# Altium footprint library Standard.PcbLib: 137 footprints (part 3 of 9)
Each footprint in its own frame and in the unit in brackets; x right, y up, seen from the top. Pads: shape width x height; smd on the part's side, far side on the other; paste and mask are expansions set on the pad; w line width, h text height; cw(c..) or ccw(c..) is an arc to the next point about the centre after c.
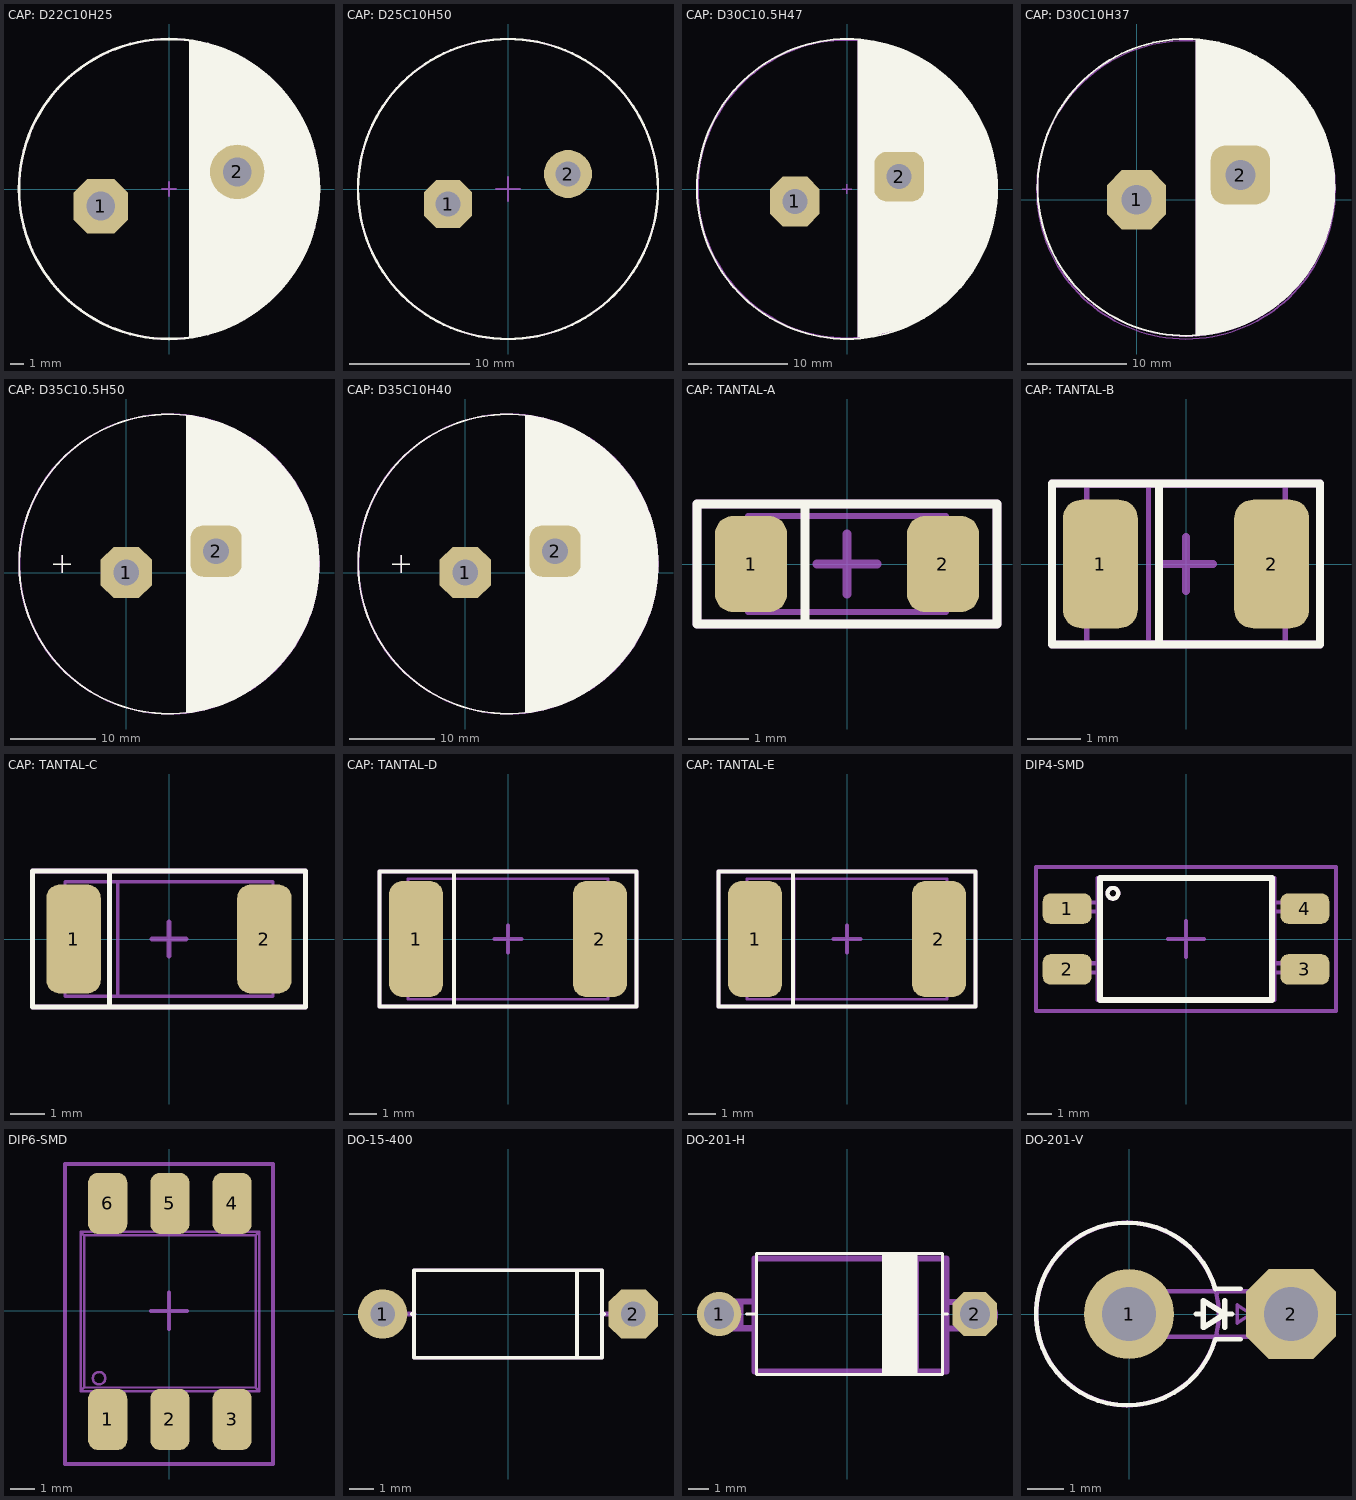
[diagram p2: the footprints below, top view; thin cyan lines are the x and y axes]

## CAP: D22C10H25 [mm]
height 25
pads (2):
  oct 4x4 hole 2.1: 1(-5,-1.25)
  round 4 hole 2.1: 2(5,1.25)
Top Overlay:
  circle w0.2: c0,0 r11
  region: 1.5,-10.9 1.5,10.9 3.275,10.5 4.4,10.075 5.45,9.55 6.475,8.9 7.7,7.875 8.575,6.875 9.425,5.7 10.175,4.25 10.625,2.825 10.9,1.575 10.975,0.35 10.975,-0.825 10.65,-2.75 10.05,-4.425 9.375,-5.725 8.075,-7.525 7.25,-8.25 6.275,-9.05 4.925,-9.875 3.975,-10.275 2.825,-10.625 1.975,-10.825
Top Assembly:
  circle w0.1: c0,0 r11
  region: 1.5,-10.9 1.5,10.9 3.275,10.5 4.4,10.075 5.45,9.55 6.475,8.9 7.7,7.875 8.575,6.875 9.425,5.7 10.175,4.25 10.625,2.825 10.9,1.575 10.975,0.35 10.975,-0.825 10.65,-2.75 10.05,-4.425 9.375,-5.725 8.075,-7.525 7.25,-8.25 6.275,-9.05 4.925,-9.875 3.975,-10.275 2.825,-10.625 1.975,-10.825
Top Component Outline:
  circle w0.15: c0,0 r11
  lines w0.15: -0.5,0 0.5,0 ; 0,-0.5 0,0.5
3D body "Конденсатор H25хD22хL10.step": height 25.05, standoff -3.75, extent -14.099,-14.099 14.099,14.099

## CAP: D25C10H50 [mm]
height 37
pads (2):
  oct 4x4 hole 2.1: 1(-5,-1.25)
  round 4 hole 2.1: 2(5,1.25)
Top Overlay:
  circle w0.2: c0,0 r12.5
Top Assembly:
  circle w0.1: c0,0 r12.5
Top Component Outline:
  circle w0.15: c0,0 r12.5
  lines w0.15: -1,0 1,0 ; 0,-1 0,1
3D body "User Library-Cap 25x50.STEP": height 50, standoff 0, extent -12.5,-12.5 12.5,12.5

## CAP: D30C10.5H47 [mm]
height 37
pads (2):
  oct 5x5 hole 2.5: 1(-5.25,-1.25)
  rrect50% 5x5 hole 2.5: 2(5.25,1.25)
Top Overlay:
  circle w0.2: c0,0 r15.1
  region: 1.1,-14.988 1.1,15.105 3.134,14.784 5.675,13.937 7.7,12.962 8.55,12.412 9.675,11.562 10.75,10.562 11.55,9.687 12.15,8.988 13.225,7.312 13.85,6.013 14.325,4.812 14.8,3.062 15.05,1.312 15.1,0.012 15,-1.663 14.75,-3.213 14.35,-4.713 13.85,-5.988 13.1,-7.462 12.35,-8.662 11,-10.288 9.75,-11.488 8.45,-12.462 7.025,-13.313 6.125,-13.738 4.975,-14.188 3.725,-14.538 2.3,-14.9
Top Assembly:
  circle w0.1: c0,0 r15.05
  region: 1.1,-14.988 1.1,15.037 3.425,14.689 5.217,14.158 7.7,12.962 8.55,12.412 9.675,11.562 10.75,10.562 11.55,9.687 12.15,8.988 13.225,7.312 13.85,6.013 14.325,4.812 14.8,3.062 15.05,1.312 15.1,0.012 15,-1.663 14.75,-3.213 14.35,-4.713 13.85,-5.988 13.1,-7.462 12.35,-8.662 11,-10.288 9.75,-11.488 8.45,-12.462 7.025,-13.313 6.125,-13.738 4.975,-14.188 3.725,-14.538 2.3,-14.9
Top Component Outline:
  circle w0.15: c0,0 r15
  lines w0.15: -0.5,0 0.5,0 ; 0,-0.5 0,0.5
3D body "Capacitor D30C10H47.STEP": height 47, standoff 0, extent -15,-15 15,15

## CAP: D30C10H37 [mm]
height 37
pads (2):
  oct 6x6 hole 3: 1(0,0)
  rrect50% 6x6 hole 3: 2(10.5,2.5)
Top Overlay:
  circle w0.2: c5,1.25 r15
  region: 6,-13.8 6,16.205 8.532,15.806 10.575,15.125 12.6,14.15 13.45,13.6 14.575,12.75 15.65,11.75 16.45,10.875 17.05,10.175 18.125,8.5 18.75,7.2 19.225,6 19.7,4.25 19.95,2.5 20,1.2 19.9,-0.475 19.65,-2.025 19.25,-3.525 18.75,-4.8 18,-6.275 17.25,-7.475 15.9,-9.1 14.65,-10.3 13.35,-11.275 11.925,-12.125 11.025,-12.55 9.875,-13 8.625,-13.35 7.6,-13.55 6.025,-13.775
Top Assembly:
  circle w0.1: c5,1.2 r15
  region: 6,-13.8 6,16.175 8.7,15.75 10.575,15.125 12.6,14.15 13.45,13.6 14.575,12.75 15.65,11.75 16.45,10.875 17.05,10.175 18.125,8.5 18.75,7.2 19.225,6 19.7,4.25 19.95,2.5 20,1.2 19.9,-0.475 19.65,-2.025 19.25,-3.525 18.75,-4.8 18,-6.275 17.25,-7.475 15.9,-9.1 14.65,-10.3 13.35,-11.275 11.925,-12.125 11.025,-12.55 9.875,-13 8.625,-13.35 7.6,-13.55 6.025,-13.775
Top Component Outline:
  circle w0.15: c5,1 r15.075
3D body "User Library-Assy_CE_R400_D1200_H1450.STEP": height 36.83, standoff -6.89, extent -12.7,-16.473 22.61,18.836

## CAP: D35C10.5H50 [mm]
height 50
pads (2):
  oct 6x6 hole 3: 1(0,0)
  rrect50% 6x6 hole 3: 2(10.5,2.5)
Top Overlay:
  circle w0.2: c5,1 r17.5
  region: 7,18.3 7.525,18.3 8.625,18.075 10,17.75 11.25,17.3 12.625,16.725 13.875,16.05 15.225,15.175 16.2,14.45 17.35,13.35 18.45,12.15 19.25,11.125 19.7,10.425 20.425,9.2 20.925,8.15 21.375,7.075 21.875,5.525 22.125,4.375 22.375,2.675 22.45,1.25 22.425,-0.025 22.325,-1.15 22.175,-2.2 21.725,-4.1 21.4,-5.025 20.525,-7.025 19.275,-9.05 18.4,-10.2 17.125,-11.55 15.65,-12.85 13.756,-14.143 11.88,-15.09 10.8,-15.45 9.025,-16.025 7.5,-16.3 7,-16.35
  lines w0.15: -8.5,1 -6.5,1 ; -7.5,0 -7.5,2
Top Assembly:
  circle w0.1: c5,1 r17.464
  region: 7,18.3 7.525,18.3 8.625,18.075 10,17.75 11.25,17.3 12.625,16.725 13.875,16.05 15.225,15.175 16.2,14.45 17.35,13.35 18.45,12.15 19.25,11.125 19.7,10.425 20.425,9.2 20.925,8.15 21.375,7.075 21.875,5.525 22.125,4.375 22.375,2.675 22.45,1.25 22.425,-0.025 22.325,-1.15 22.175,-2.2 21.725,-4.1 21.4,-5.025 20.525,-7.025 19.275,-9.05 18.4,-10.2 17.125,-11.55 15.65,-12.85 13.756,-14.143 11.88,-15.09 10.8,-15.45 9.025,-16.025 7.5,-16.3 7,-16.35
  lines w0.1: -8.5,1 -6.5,1 ; -7.5,0 -7.5,2
Top Component Outline:
  circle w0.15: c5,1 r17.529
3D body "User Library-el_cap_470uF-400V.STEP": height 46.7, standoff -3.5, extent -15.756,-19.756 25.756,21.756

## CAP: D35C10H40 [mm]
height 50
pads (2):
  oct 6x6 hole 3: 1(0,0)
  rrect50% 6x6 hole 3: 2(10.5,2.5)
Top Overlay:
  circle w0.2: c5,1 r17.5
  region: 7,18.3 7.525,18.3 8.625,18.075 10,17.75 11.25,17.3 12.625,16.725 13.875,16.05 15.225,15.175 16.2,14.45 17.35,13.35 18.45,12.15 19.25,11.125 19.7,10.425 20.425,9.2 20.925,8.15 21.375,7.075 21.875,5.525 22.125,4.375 22.375,2.675 22.45,1.25 22.425,-0.025 22.325,-1.15 22.175,-2.2 21.725,-4.1 21.4,-5.025 20.525,-7.025 19.275,-9.05 18.4,-10.2 17.125,-11.55 15.65,-12.85 13.756,-14.143 11.88,-15.09 10.8,-15.45 9.025,-16.025 7.5,-16.3 7,-16.35
  lines w0.15: -8.5,1 -6.5,1 ; -7.5,0 -7.5,2
Top Assembly:
  circle w0.1: c5,1 r17.464
  region: 7,18.3 7.525,18.3 8.625,18.075 10,17.75 11.25,17.3 12.625,16.725 13.875,16.05 15.225,15.175 16.2,14.45 17.35,13.35 18.45,12.15 19.25,11.125 19.7,10.425 20.425,9.2 20.925,8.15 21.375,7.075 21.875,5.525 22.125,4.375 22.375,2.675 22.45,1.25 22.425,-0.025 22.325,-1.15 22.175,-2.2 21.725,-4.1 21.4,-5.025 20.525,-7.025 19.275,-9.05 18.4,-10.2 17.125,-11.55 15.65,-12.85 13.756,-14.143 11.88,-15.09 10.8,-15.45 9.025,-16.025 7.5,-16.3 7,-16.35
  lines w0.1: -8.5,1 -6.5,1 ; -7.5,0 -7.5,2
Top Component Outline:
  circle w0.15: c5,1 r17.529
3D body "Capacitor D35H40.STEP": height 40, standoff 0, extent -13,-17 23,19

## CAP: TANTAL-A [mm]
height 1.6
pads (2):
  rrect50% 1.2x1.6 smd: 1(-1.6,0) 2(1.6,0)
Top Overlay:
  lines w0.15: -0.7,-1 -0.7,1 ; -2.5,-1 -2.5,1 2.5,1 2.5,-1 -2.5,-1
Top Assembly:
  lines w0.1: -0.7,-0.8 -0.7,0.8 ; -1.651,-0.8 -1.651,0.8 1.651,0.8 1.651,-0.8 -1.651,-0.8
Top Component Outline:
  lines w0.15: -0.5,0 0.5,0 ; 0,-0.5 0,0.5 ; -2.5,-1 2.5,-1 2.5,1 -2.5,1 -2.5,-1
3D body "User Library-AVX_ACASE.STEP": height 1.71, standoff 0, extent -1.7,-0.84 1.7,0.84

## CAP: TANTAL-B [mm]
height 1.9
pads (2):
  rrect50% 1.4x2.4 smd: 1(-1.6,0) 2(1.6,0)
Top Overlay:
  lines w0.15: -0.5,-1.5 -0.5,1.5 ; -2.5,-1.5 -2.5,1.5 2.5,1.5 2.5,-1.5 -2.5,-1.5
Top Assembly:
  lines w0.1: -0.7,-1.465 -0.7,1.465 ; -1.85,-1.465 -1.85,1.465 1.85,1.465 1.85,-1.465 -1.85,-1.465
Top Component Outline:
  lines w0.15: -0.5,0 0.5,0 ; 0,-0.5 0,0.5 ; -2.5,-1.5 2.5,-1.5 2.5,1.5 -2.5,1.5 -2.5,-1.5
3D body "User Library-AVX_BCASE.STEP": height 2.03, standoff 0, extent -1.85,-1.465 1.85,1.465

## CAP: TANTAL-C [mm]
height 2.5
pads (2):
  rrect50% 1.6x3.2 smd: 1(-2.8,0) 2(2.8,0)
Top Overlay:
  lines w0.15: -1.75,-2 -1.75,2 ; -4,-2 4,-2 4,2 -4,2 -4,-2
Top Assembly:
  lines w0.1: -1.5,-1.675 -1.5,1.675 ; -3.05,-1.675 -3.05,1.675 3.05,1.675 3.05,-1.675 -3.05,-1.675
Top Component Outline:
  lines w0.15: -0.5,0 0.5,0 ; 0,-0.5 0,0.5 ; -4,-2 -4,2 4,2 4,-2 -4,-2
3D body "User Library-AVX_C_CASE.STEP": height 2.7, standoff 0, extent -3.05,-1.675 3.05,1.675

## CAP: TANTAL-D [mm]
height 2.9
pads (2):
  rrect50% 2x4.3 smd: 1(-3.4,0) 2(3.4,0)
Top Overlay:
  lines w0.15: -2,-2.5 -2,2.5 ; -4.75,-2.5 4.75,-2.5 4.75,2.5 -4.75,2.5 -4.75,-2.5
Top Assembly:
  lines w0.1: -2.025,-2.225 -2.025,2.225 ; -3.7,-2.225 -3.7,2.225 3.7,2.225 3.7,-2.225 -3.7,-2.225
Top Component Outline:
  lines w0.15: -0.5,0 0.5,0 ; 0,-0.5 0,0.5 ; -4.75,-2.5 -4.75,2.5 4.75,2.5 4.75,-2.5 -4.75,-2.5
3D body "User Library-AVX_D_CASE.STEP": height 3.01, standoff 0, extent -3.7,-2.225 3.7,2.225

## CAP: TANTAL-E [mm]
height 2.9
pads (2):
  rrect50% 2x4.3 smd: 1(-3.4,0) 2(3.4,0)
Top Overlay:
  lines w0.15: -2,-2.5 -2,2.5 ; -4.75,-2.5 -4.75,2.5 4.75,2.5 4.75,-2.5 -4.75,-2.5
Top Assembly:
  lines w0.1: -1.95,-2.225 -1.95,2.225 ; -3.7,-2.225 -3.7,2.225 3.7,2.225 3.7,-2.225 -3.7,-2.225
Top Component Outline:
  lines w0.15: -0.5,0 0.5,0 ; 0,-0.5 0,0.5 ; -4.75,-2.5 4.75,-2.5 4.75,2.5 -4.75,2.5 -4.75,-2.5
3D body "User Library-AVX_E_CASE.STEP": height 4.2, standoff 0, extent -3.7,-2.225 3.7,2.225

## DIP4-SMD [mil]
pads (4):
  rrect50% 80x50 smd: 1(-195,50) 2(-195,-50) 3(195,-50) 4(195,50)
Top Overlay:
  circle w7.01: c-120,75 r8.79
  lines w10: -140.75,-100 140.75,-100 140.75,100 -140.75,100 -140.75,-100
Top Assembly:
  circle w7.01: c-120,75 r8.79
  lines w7.01: -145,-55 -190,-55 -190,-40 -145,-40 ; -145,45 -190,45 -190,60 -145,60 ; 145,-55 190,-55 190,-40 145,-40 ; 145,45 190,45 190,60 145,60 ; -145,-100 145,-100 145,100 -145,100 -145,-100
Top Component Outline:
  lines w5.91: -29.53,0 29.53,0 ; 0,-29.53 0,29.53 ; -246.06,-118.11 -246.06,118.11 246.06,118.11 246.06,-118.11 -246.06,-118.11
3D body "User Library-PC817_Gullwing.STEP": height 151.57, standoff -0.06, extent -196.85,-90.16 196.85,90.15

## DIP6-SMD [mm]
pads (6):
  rrect50% 1.6x2.5 smd: 1(-2.503,-4.431) 2(0.037,-4.431) 3(2.577,-4.431) 4(2.577,4.391) 5(0.037,4.391) 6(-2.503,4.391)
Top Assembly:
  circle w0.1: c-2.854,-2.747 r0.254
  lines w0.1: -3.1,-3.271 -3.1,-3.508 ; -3.1,3.231 -3.1,3.468 ; -1.906,-3.271 -1.906,-3.508 ; -1.906,3.231 -1.906,3.468 ; -0.56,-3.271 -0.56,-3.508 ; -0.56,3.231 -0.56,3.468 ; 0.634,-3.271 0.634,-3.508 ; 0.634,3.231 0.634,3.468 ; 1.98,-3.271 1.98,-3.508 ; 1.98,3.231 1.98,3.468 ; 3.174,-3.271 3.174,-3.508 ; 3.174,3.231 3.174,3.468 ; -3.608,-3.271 -3.608,3.231 ; -3.608,-3.271 -3.464,-3.127 ; -3.608,-3.271 3.682,-3.271 ; -3.608,3.231 -3.464,3.087 ; -3.608,3.231 3.682,3.231 ; -3.464,-3.127 -3.464,3.087 ; -3.464,-3.127 3.537,-3.127 ; -3.464,3.087 3.537,3.087 ; -3.1,-4.431 -1.906,-4.431 ; -3.1,-4.431 -3.1,-5.1 -1.906,-5.1 -1.906,-4.431 ; -3.1,-4.431 -3.1,-4.056 ; -3.1,-4.056 -1.906,-4.056 ; -3.1,-4.056 -3.1,-3.884 ; -3.1,-3.884 -1.906,-3.884 ; -3.1,-3.884 -3.1,-3.508 ; -3.1,-3.508 -1.906,-3.508 ; -3.1,3.468 -1.906,3.468 ; -3.1,3.468 -3.1,3.844 ; -3.1,3.844 -1.906,3.844 ; -3.1,3.844 -3.1,4.016 ; -3.1,4.016 -1.906,4.016 ; -3.1,4.016 -3.1,4.391 ; -3.1,4.391 -1.906,4.391 ; -3.1,4.391 -3.1,5.06 -1.906,5.06 -1.906,4.391 ; -1.906,-4.431 -1.906,-4.056 ; -1.906,-4.056 -1.906,-3.884 ; -1.906,-3.884 -1.906,-3.508 ; -1.906,3.468 -1.906,3.844 ; -1.906,3.844 -1.906,4.016 ; -1.906,4.016 -1.906,4.391 ; -0.56,-4.431 0.634,-4.431 ; -0.56,-4.431 -0.56,-5.1 0.634,-5.1 0.634,-4.431 ; -0.56,-4.431 -0.56,-4.056 ; -0.56,-4.056 0.634,-4.056 ; -0.56,-4.056 -0.56,-3.884 ; -0.56,-3.884 0.634,-3.884 ; -0.56,-3.884 -0.56,-3.508 ; -0.56,-3.508 0.634,-3.508 ; -0.56,3.468 0.634,3.468 ; -0.56,3.468 -0.56,3.844 ; -0.56,3.844 0.634,3.844 ; -0.56,3.844 -0.56,4.016 ; -0.56,4.016 0.634,4.016 ; -0.56,4.016 -0.56,4.391 ; -0.56,4.391 0.634,4.391 ; -0.56,4.391 -0.56,5.06 0.634,5.06 0.634,4.391 ; 0.634,-4.431 0.634,-4.056 ; 0.634,-4.056 0.634,-3.884 ; 0.634,-3.884 0.634,-3.508 ; 0.634,3.468 0.634,3.844 ; 0.634,3.844 0.634,4.016 ; 0.634,4.016 0.634,4.391 ; 1.98,-4.431 3.174,-4.431 ; 1.98,-4.431 1.98,-5.1 3.174,-5.1 3.174,-4.431 ; 1.98,-4.431 1.98,-4.056 ; 1.98,-4.056 3.174,-4.056 ; 1.98,-4.056 1.98,-3.884 ; 1.98,-3.884 3.174,-3.884 ; 1.98,-3.884 1.98,-3.508 ; 1.98,-3.508 3.174,-3.508 ; 1.98,3.468 3.174,3.468 ; 1.98,3.468 1.98,3.844 ; 1.98,3.844 3.174,3.844 ; 1.98,3.844 1.98,4.016 ; 1.98,4.016 3.174,4.016 ; 1.98,4.016 1.98,4.391 ; 1.98,4.391 3.174,4.391 ; 1.98,4.391 1.98,5.06 3.174,5.06 3.174,4.391 ; 3.174,-4.431 3.174,-4.056 ; 3.174,-4.056 3.174,-3.884 ; 3.174,-3.884 3.174,-3.508 ; 3.174,3.468 3.174,3.844 ; 3.174,3.844 3.174,4.016 ; 3.174,4.016 3.174,4.391 ; 3.537,-3.127 3.682,-3.271 ; 3.537,-3.127 3.537,3.087 ; 3.537,3.087 3.682,3.231 ; 3.682,-3.271 3.682,3.231
Top Component Outline:
  lines w0.15: -0.75,0 0.75,0 ; 0,-0.75 0,0.75 ; -4.25,-6.25 4.25,-6.25 4.25,6 -4.25,6 -4.25,-6.25
3D body "User Library-6-SMD.step": height 3.62, standoff 0.01, extent -3.6,-5.08 3.69,5.08

## DO-15-400 [mm]
pads (2):
  round 2 hole 1: 1(-5.08,0)
  oct 2x2 hole 1: 2(5.08,0)
Top Overlay:
  lines w0.15: -3.9,0 -3.81,0 ; 2.794,-1.778 2.794,1.778 ; 3.81,0 3.9,0 ; -3.81,-1.778 -3.81,1.778 3.81,1.778 3.81,-1.778 -3.81,-1.778
Top Assembly:
  circle w0.254: c-5.08,0 r0.381
  circle w0.254: c5.08,0 r0.381
  lines w0.125: 2.794,-1.778 2.794,1.778 ; -3.81,-1.778 3.81,-1.778 3.81,1.778 -3.81,1.778 -3.81,-1.778
  lines w0.2: -4.572,0 -3.81,0 ; 3.81,0 4.572,0
3D body "DO-15-400.STEP": height 4.78, standoff -1, extent -5.51,-1.782 5.51,1.783

## DO-201-H [mm]
pads (2):
  round 2.2 hole 1.5: 1(-6.35,0)
  oct 2.2x2.2 hole 1.5: 2(6.35,0)
Top Overlay:
  region: 1.75,3 3.5,3 3.5,-3 1.75,-3
  lines w0.15: -5,0 -4.5,0 ; 1.925,-2.794 1.925,2.794 ; 3.425,-2.794 3.425,2.794 ; 4.826,0 5,0 ; -4.5,-3 4.75,-3 4.75,3 -4.5,3 -4.5,-3
Top Assembly:
  lines w0.3: -6.3,-0.707 -5.294,-0.707 ; -6.294,-0.707 cw(c-6.294,-0.047) -6.294,0.613 ; -6.2,0.613 -5.294,0.613 ; -5.294,0.612 -5.294,-0.047 -5.294,-0.707 ; -4.594,-0.707 -5.294,-0.707 ; -4.594,0.613 -5.294,0.613 ; 4.994,-0.713 5.694,-0.713 ; 4.994,0.607 5.694,0.607 ; 6.6,-0.713 5.694,-0.713 ; 6.694,-0.713 ccw(c6.694,-0.053) 6.694,0.607 ; 6.7,0.607 5.694,0.607 ; -5.294,-0.707 -5.294,0.613 ; 1.936,-2.847 1.936,2.753 ; 1.936,-2.847 -4.594,-2.847 -4.594,2.753 1.936,2.753 ; 1.936,-2.847 3.436,-2.847 ; 1.936,2.753 3.436,2.753 ; 3.436,-2.847 3.436,2.753 ; 3.436,-2.847 4.936,-2.847 4.936,2.753 3.436,2.753 ; 5.694,-0.713 5.694,0.607 ; 5.694,-0.712 5.694,-0.053 5.694,0.607
3D body "DO-201-500.STEP": height 5.82, standoff -3, extent -7,-2.825 7,2.825

## DO-201-V [mm]
pads (2):
  round 2.5 hole 1.5: 1(0,0)
  oct 2.5x2.5 hole 1.5: 2(4.5,0)
Top Overlay:
  lines w0.125: 2.397,-0.699 cw(c-0.045,0) 2.399,0.692 ; 2.4,-0.7 3.1,-0.7 ; 2.4,0.7 3.1,0.7
  lines w0.15: 1.86,0 2.06,0 ; 2.06,-0.371 2.06,0.376 2.66,0 ; 2.065,-0.376 2.66,0 ; 2.66,-0.373 2.66,0.373 ; 2.86,0 2.66,0
Top Assembly:
  circle w0.125: c-0.045,0 r2.535
  lines w0.1: 3.389,-0.254 3.389,0.254 ; 3.008,-0.254 3.008,0.254 3.389,0 3.008,-0.254
  lines w0.125: 4.913,-0.635 ccw(c4.913,0) 4.913,0.635 ; 5.04,-0.635 -0.04,-0.635 cw(c-0.04,0) -0.04,0.635 5.04,0.635
3D body "DO-201-200 Ver.STEP": height 11.55, standoff -1.55, extent -2.84,-2.8 5.64,2.8